# Altium footprint library Library 3D.PcbLib: 288 footprints (part 13 of 18)
Each footprint in its own frame and in the unit in brackets; x right, y up, seen from the top. Pads: shape width x height; smd on the part's side, far side on the other; paste and mask are expansions set on the pad; w line width, h text height; cw(c..) or ccw(c..) is an arc to the next point about the centre after c.
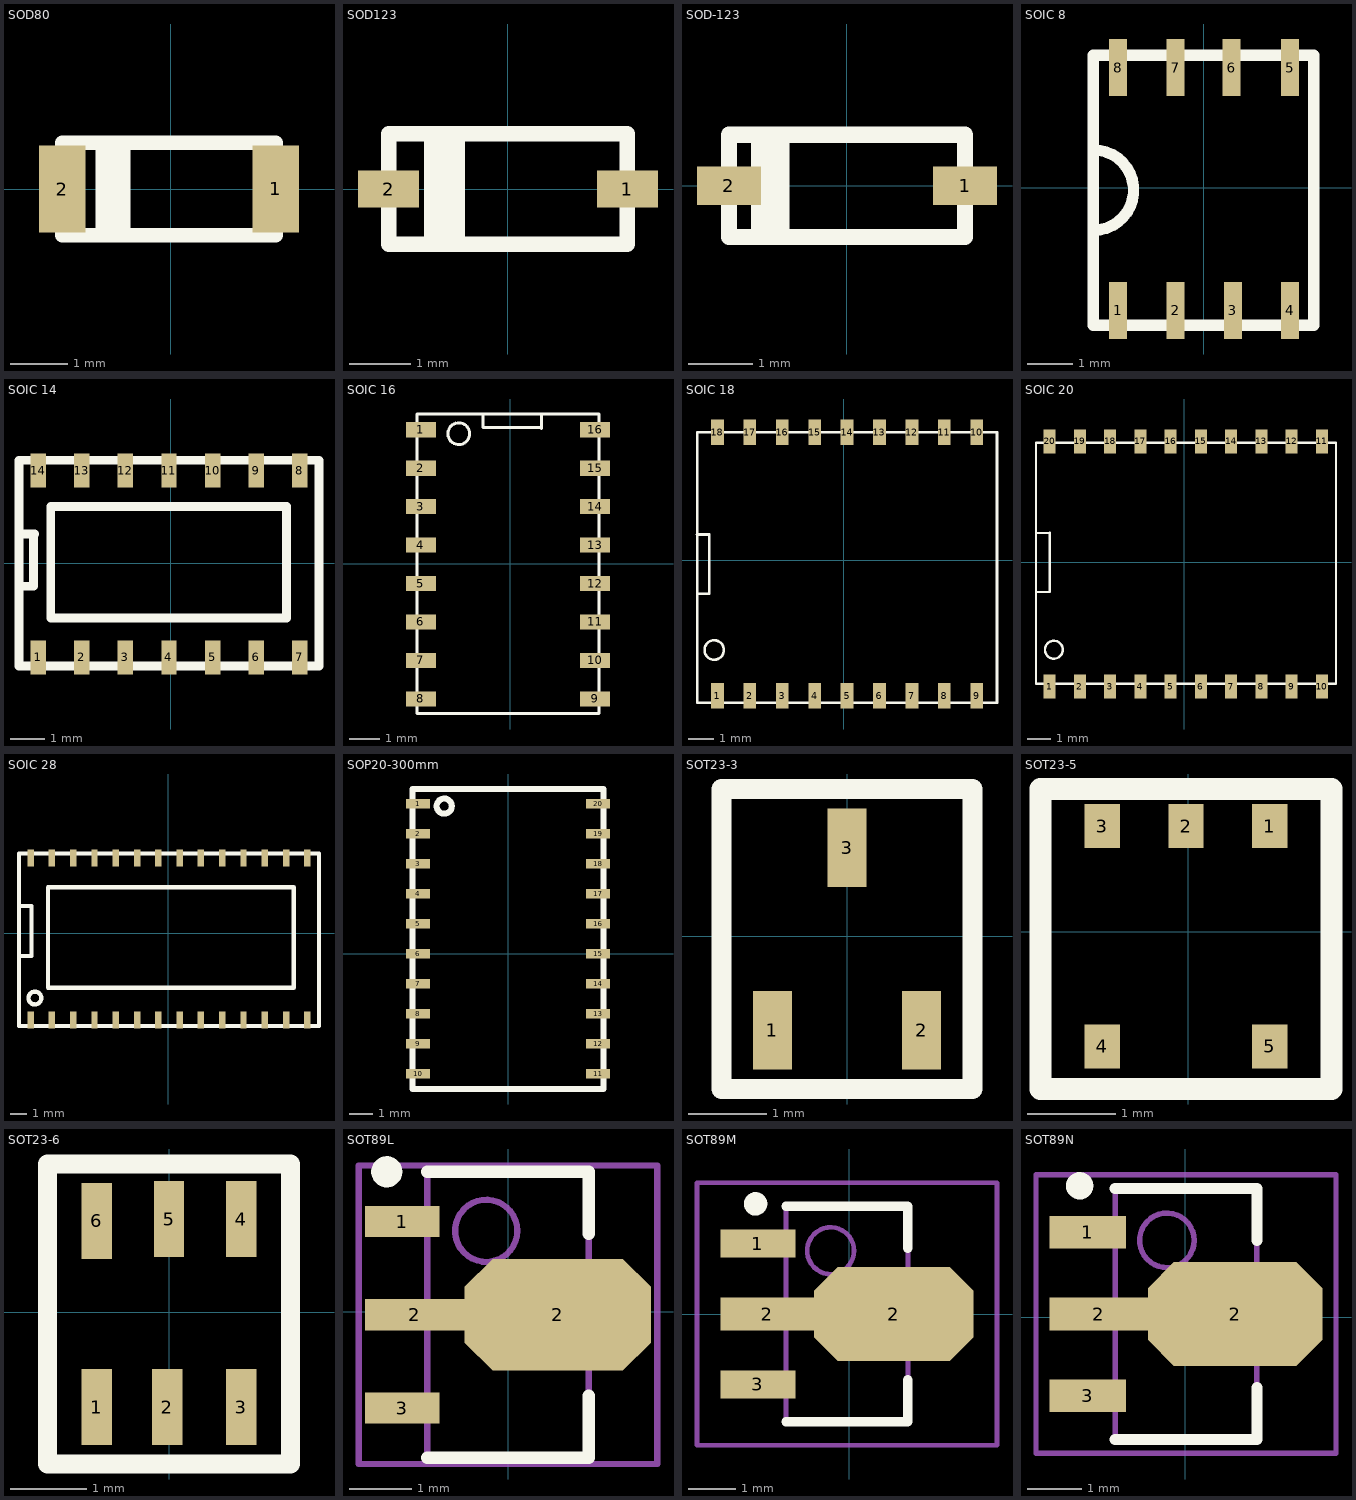
[diagram p12: the footprints below, top view; thin cyan lines are the x and y axes]

## SOD80 [mm]
pads (2):
  rect 0.8x1.5 all layers, no hole: 1(1.82,0) 2(-1.88,0)
Top Overlay:
  rectangle: -1.3,-0.8 -0.7,0.8
  lines w0.254: -1.88,-0.8 1.82,-0.8 1.82,0.8 -1.88,0.8 -1.88,-0.8
3D body "MiniMelf-2.STEP": height 1.6, standoff 0, extent -1.88,-0.8 1.82,0.8

## SOD123 [mm]
pads (2):
  rect 1x0.6 smd: 1(1.95,0) 2(-1.95,0)
Top Overlay:
  rectangle: -1.375,-0.775 -0.7,0.875
  lines w0.254: -1.95,-0.9 -1.95,0.9 1.95,0.9 1.95,-0.9 -1.95,-0.9
3D body "User Library-SOD123-1.STEP": height 1.18, standoff 0, extent -1.95,-0.9 1.95,0.9

## SOD-123 [mm]
pads (2):
  rect 1x0.6 all layers, no hole: 1(1.849,0) 2(-1.849,0)
Top Overlay:
  rectangle: -1.5,-0.9 -0.9,0.7
  lines w0.254: -1.849,-0.8 1.849,-0.8 1.849,0.8 -1.849,0.8 -1.849,-0.8
3D body "SOD-123.STEP": height 1.25, standoff 0, extent -1.849,-0.8 1.849,0.8

## SOIC 8 [mm]
pads (8):
  rect 0.4x1.27 smd: 1(-1.9,-2.725) 2(-0.625,-2.725) 3(0.65,-2.725) 4(1.925,-2.725) 5(1.925,2.675) 6(0.625,2.675) 7(-0.625,2.675) 8(-1.9,2.675)
Top Overlay:
  lines w0.254: -2.45,-0.943 ccw(c-2.45,-0.05) -2.45,0.843 ; -2.45,-3.05 -2.45,2.95 2.45,2.95 2.45,-3.05 -2.45,-3.05
3D body "User Library-SOIC-8-1.STEP": height 1.75, standoff 0, extent -2.45,-3.05 2.45,2.95

## SOIC 14 [mm]
pads (14):
  rect 0.45x1 smd: 1(-3.86,-2.75) 2(-2.59,-2.75) 3(-1.32,-2.75) 4(-0.05,-2.75) 5(1.22,-2.75) 6(2.49,-2.75) 7(3.76,-2.75) 8(3.76,2.7) 9(2.49,2.7) 10(1.22,2.7) 11(-0.05,2.7) 12(-1.32,2.7) 13(-2.59,2.7) 14(-3.86,2.7)
Top Overlay:
  lines w0.254: -4.425,-0.675 -4,-0.675 -4,0.825 -3.975,0.85 -4.425,0.85 ; 4.325,3 -4.425,3 -4.425,-3 4.225,-3 4.325,-3 4.325,3 ; 4.325,3 4.325,3 ; -3.5,-1.6 3.375,-1.6 3.375,1.65 -3.5,1.65 -3.5,-1.6
3D body "User Library-SOIC-14.STEP": height 1.75, standoff 0, extent -4.425,-3 4.325,3

## SOIC 16 [mm]
pads (16):
  rect 1x0.5 smd: 1(-2.95,4.43) 2(-2.95,3.16) 3(-2.95,1.89) 4(-2.95,0.62) 5(-2.95,-0.65) 6(-2.95,-1.92) 7(-2.95,-3.19) 8(-2.95,-4.46) 9(2.8,-4.46) 10(2.8,-3.19) 11(2.8,-1.92) 12(2.8,-0.65) 13(2.8,0.62) 14(2.8,1.89) 15(2.8,3.16) 16(2.8,4.43)
Top Overlay:
  circle w0.1: c-1.7,4.3 r0.361
  lines w0.1: -0.9,4.95 -0.9,4.5 1,4.5 1.025,4.475 1.025,4.95 ; -3.075,-4.95 -3.075,4.95 2.925,4.95 2.925,-4.95 -3.075,-4.95
3D body "User Library-SOIC-16.STEP": height 1.4, standoff 0, extent -3.075,-4.95 2.925,4.95

## SOIC 18 [mm]
pads (18):
  rect 0.5x1 smd: 1(-4.95,-5.325) 2(-3.68,-5.325) 3(-2.41,-5.325) 4(-1.14,-5.325) 5(0.13,-5.325) 6(1.4,-5.325) 7(2.67,-5.325) 8(3.94,-5.325) 9(5.21,-5.325) 10(5.21,5.015) 11(3.94,5.015) 12(2.67,5.015) 13(1.4,5.015) 14(0.13,5.015) 15(-1.14,5.015) 16(-2.41,5.015) 17(-3.68,5.015) 18(-4.95,5.015)
Top Overlay:
  circle w0.1: c-5.075,-3.525 r0.381
  lines w0.1: -5.75,1 -5.275,1 -5.275,-1.325 -5.7,-1.325 ; -5.745,-5.585 -5.745,5.015 6.005,5.015 6.005,-5.585 -5.745,-5.585
3D body "User Library-SOIC-18-300.STEP": height 2.57, standoff -0.03, extent -5.745,-5.585 6.005,5.015

## SOIC 20 [mm]
pads (20):
  rect 0.5x1 smd: 1(-5.65,-5.225) 2(-4.38,-5.225) 3(-3.11,-5.225) 4(-1.84,-5.225) 5(-0.57,-5.225) 6(0.7,-5.225) 7(1.97,-5.225) 8(3.24,-5.225) 9(4.51,-5.225) 10(5.78,-5.225) 11(5.78,5.075) 12(4.51,5.075) 13(3.24,5.075) 14(1.97,5.075) 15(0.7,5.075) 16(-0.57,5.075) 17(-1.84,5.075) 18(-3.11,5.075) 19(-4.38,5.075) 20(-5.65,5.075)
Top Overlay:
  circle w0.1: c-5.475,-3.675 r0.375
  lines w0.1: -6.225,-1.275 -6.2,-1.25 -5.65,-1.25 -5.65,1.25 -5.675,1.225 -6.225,1.225 ; -6.225,-5.109 -6.225,5.025 6.375,5.025 6.375,-5.109 -6.225,-5.109
3D body "User Library-SOIC20.STEP": height 2.2, standoff -0.04, extent -6.225,-5.109 6.375,5.025

## SOIC 28 [mm]
pads (28):
  rect 0.38x1 smd: 1(-8.22,-5.172) 2(-6.95,-5.172) 3(-5.68,-5.172) 4(-4.41,-5.172) 5(-3.14,-5.172) 6(-1.87,-5.172) 7(-0.6,-5.172) 8(0.67,-5.172) 9(1.94,-5.172) 10(3.21,-5.172) 11(4.48,-5.172) 12(5.75,-5.172) 13(7.02,-5.172) 14(8.29,-5.172) 15(8.29,4.498) 16(7.02,4.498) 17(5.75,4.498) 18(4.48,4.498) 19(3.21,4.498) 20(1.94,4.498) 21(0.67,4.498) 22(-0.6,4.498) 23(-1.87,4.498) 24(-3.14,4.498) 25(-4.41,4.498) 26(-5.68,4.498) 27(-6.95,4.498) 28(-8.22,4.498)
Top Overlay:
  circle w0.254: c-7.966,-3.859 r0.381
  lines w0.254: -8.906,-1.344 -8.169,-1.344 -8.169,1.627 -8.906,1.627 ; -8.915,-5.529 -8.915,4.771 8.985,4.771 8.985,-5.529 -8.915,-5.529 ; -7.179,-3.249 7.477,-3.249 7.477,2.745 -7.179,2.745 -7.179,-3.249
3D body "SW3dPS-SOIC28-300.STEP": height 2.65, standoff 0, extent -8.915,-5.529 8.985,4.771

## SOP20-300mm [mm]
pads (20):
  rect 1x0.4 smd: 1(-3.81,6.35) 2(-3.81,5.08) 3(-3.81,3.81) 4(-3.81,2.54) 5(-3.81,1.27) 6(-3.81,0) 7(-3.81,-1.27) 8(-3.81,-2.54) 9(-3.81,-3.81) 10(-3.81,-5.08) 11(3.81,-5.08) 12(3.81,-3.81) 13(3.81,-2.54) 14(3.81,-1.27) 15(3.81,0) 16(3.81,1.27) 17(3.81,2.54) 18(3.81,3.81) 19(3.81,5.08) 20(3.81,6.35)
Top Overlay:
  circle w0.254: c-2.7,6.25 r0.32
  lines w0.254: -4.05,-5.725 -4.05,6.975 4.05,6.975 4.05,-5.575 4.05,-5.725 -4.05,-5.725
3D body "User Library-SOP20.STEP": height 2, standoff 0, extent -4.05,-5.725 4.05,6.975

## SOT23-3 [mm]
pads (3):
  rect 0.5x1 smd: 1(-0.95,-1.2) 2(0.95,-1.2) 3(0,1.125)
Top Overlay:
  lines w0.254: -1.6,-1.95 -1.6,1.875 1.6,1.875 1.6,-1.95 -1.6,-1.95
3D body "User Library-SOT23-3.STEP": height 1.3, standoff 0, extent -1.45,-1.4 1.45,1.4

## SOT23-5 [mm]
pads (5):
  rect 0.4x0.5 smd: 1(0.925,1.2) 2(-0.025,1.2) 3(-0.975,1.2) 4(-0.975,-1.3) 5(0.925,-1.3)
Top Overlay:
  lines w0.254: -1.676,-1.783 -1.676,1.621 1.626,1.621 1.626,-1.783 -1.676,-1.783
3D body "User Library-SOT-23-5.STEP": height 1.45, standoff -0.01, extent -1.525,-1.53 1.475,1.47

## SOT23-6 [mm]
pads (6):
  rect 0.4x1 smd: 1(-0.95,-1.25) 2(-0.025,-1.25) 3(0.95,-1.25) 4(0.95,1.225) 5(0,1.225) 6(-0.95,1.2)
Top Overlay:
  lines w0.254: -1.6,-2 -1.6,1.95 1.6,1.95 1.6,-2 -1.6,-2
3D body "User Library-SOT23-6-2.STEP": height 1.45, standoff 0, extent -1.45,-1.4 1.45,1.4

## SOT89L [mm]
pads (4):
  rect 1.2x0.5 smd: 1(-1.7,1.45) 3(-1.7,-1.55)
  rect 1.6x0.5 smd: 2(-1.5,-0.05)
  oct 3x1.8 smd: 2(0.8,-0.05)
Top Overlay:
  circle w0.25: c-1.95,2.25 r0.125
  lines w0.2: -1.3,-2.35 1.3,-2.35 1.3,-1.35 ; -1.3,2.25 1.3,2.25 1.3,1.25
Mechanical 13:
  circle w0.1: c-0.35,1.3 r0.5
  lines w0.1: -1.3,-2.35 -1.3,2.25 1.3,2.25 1.3,-2.35 -1.3,-2.35
Mechanical 15:
  lines w0.1: -0.5,-0.05 0.5,-0.05 ; 0,-0.55 0,0.45 ; -2.4,-2.45 -2.4,2.35 2.4,2.35 2.4,-2.45 -2.4,-2.45
3D body: height 1.6, standoff 0, extent -1.3,-2.35 1.3,2.25

## SOT89M [mm]
pads (4):
  rect 1.6x0.6 smd: 1(-1.95,1.5) 3(-1.95,-1.5)
  rect 2x0.7 smd: 2(-1.75,0)
  oct 3.4x2 smd: 2(0.95,0)
Top Overlay:
  circle w0.25: c-2,2.35 r0.125
  lines w0.2: -1.35,-2.3 1.25,-2.3 1.25,-1.4 ; -1.35,2.3 1.25,2.3 1.25,1.4
Mechanical 13:
  circle w0.1: c-0.4,1.35 r0.5
  lines w0.1: -1.35,-2.3 1.25,-2.3 1.25,2.3 -1.35,2.3 -1.35,-2.3
Mechanical 15:
  lines w0.1: -0.55,0 0.45,0 ; -0.05,-0.5 -0.05,0.5 ; -3.25,-2.8 3.15,-2.8 3.15,2.8 -3.25,2.8 -3.25,-2.8
3D body: height 1.6, standoff 0, extent -1.35,-2.3 1.25,2.3

## SOT89N [mm]
pads (4):
  rect 1.4x0.6 smd: 1(-1.783,1.56) 3(-1.783,-1.44)
  rect 1.8x0.6 smd: 2(-1.583,0.06)
  oct 3.2x1.9 smd: 2(0.917,0.06)
Top Overlay:
  circle w0.25: c-1.933,2.41 r0.125
  lines w0.2: -1.283,-2.24 1.317,-2.24 1.317,-1.29 ; -1.283,2.36 1.317,2.36 1.317,1.41
Mechanical 13:
  circle w0.1: c-0.333,1.41 r0.5
  lines w0.1: -1.283,-2.24 -1.283,2.36 1.317,2.36 1.317,-2.24 -1.283,-2.24
Mechanical 15:
  lines w0.1: -0.483,0.06 0.517,0.06 ; 0.017,-0.44 0.017,0.56 ; -2.733,-2.49 -2.733,2.61 2.767,2.61 2.767,-2.49 -2.733,-2.49
3D body: height 1.6, standoff 0, extent -1.283,-2.24 1.317,2.36